# Altium schematic symbol library jlcpcb_2025_04_capacitors_extended_1206.schlib: 2503 symbols (part 12 of 14) (continued)
## NL1206B684K500CEDN
designator C?  Capacitance: 680nF  (hidden comment: *)
Capacitor, Ceramic (MLCC), 680nF, ±10%, 50V, ±10%, SMD 1206; Manufacturer: HUI JU; Manufacturer Part Number: NL1206B684K500CEDN; Package Size: 1206; JLCPCB Basic Part: No; JLCPCB Part Number: C2835168; Supplier 1: LCSC; Category: Capacitors - MLCC; Supplier Part Number 1: C2835168; Tolerance: ±10%; Voltage Rating: 50V; RoHS: Yes; ComponentLink1Description: Datasheet; ComponentLink1URL: https://wmsc.lcsc.com/wmsc/upload/file/pdf/v2/lcsc/2304140030_HUI-JU-NL1206B684K500CEDN_C2835168.pdf; ComponentLink2Description: JLCPCB Part URL; ComponentLink2URL: https://jlcpcb.com/partdetail/C2835168; ComponentLink3Description: LCSC Part URL; ComponentLink3URL: https://lcsc.com/product-detail/Multilayer-Ceramic-Capacitors-MLCC---SMD-SMT_HUI-JU-HUI-JU-NL1206B684K500CEDN_C2835168.html
footprint CAP-1206 (1206 (3216M) Capacitor)
pins: 1, 2

## NL1206B822K500CPBN
designator C?  Capacitance: 8.2nF  (hidden comment: *)
Capacitor, Ceramic (MLCC), 8.2nF, 50V, X7R, SMD 1206; Manufacturer: HUI JU; Manufacturer Part Number: NL1206B822K500CPBN; Package Size: 1206; JLCPCB Basic Part: No; JLCPCB Part Number: C2961030; Supplier 1: LCSC; Category: Capacitors - MLCC; Supplier Part Number 1: C2961030; Voltage Rating: 50V; Temperature Coefficient: X7R; RoHS: Yes; ComponentLink1Description: Datasheet; ComponentLink1URL: https://wmsc.lcsc.com/wmsc/upload/file/pdf/v2/lcsc/2201141700_HUI-JU-NL1206B822K500CPBN_C2961030.pdf; ComponentLink2Description: JLCPCB Part URL; ComponentLink2URL: https://jlcpcb.com/partdetail/C2961030; ComponentLink3Description: LCSC Part URL; ComponentLink3URL: https://lcsc.com/product-detail/Multilayer-Ceramic-Capacitors-MLCC---SMD-SMT_HUI-JU-HUI-JU-NL1206B822K500CPBN_C2961030.html
footprint CAP-1206 (1206 (3216M) Capacitor)
pins: 1, 2

## NL1206B823K500CPBN
designator C?  Capacitance: 82nF  (hidden comment: *)
Capacitor, Ceramic (MLCC), 82nF, ±10%, 50V, ±10%, SMD 1206; Manufacturer: HUI JU; Manufacturer Part Number: NL1206B823K500CPBN; Package Size: 1206; JLCPCB Basic Part: No; JLCPCB Part Number: C976248; Supplier 1: LCSC; Category: Capacitors - MLCC; Supplier Part Number 1: C976248; Tolerance: ±10%; Voltage Rating: 50V; RoHS: Yes; ComponentLink1Description: Datasheet; ComponentLink1URL: https://wmsc.lcsc.com/wmsc/upload/file/pdf/v2/lcsc/2304140030_HUI-JU-NL1206B823K500CPBN_C976248.pdf; ComponentLink2Description: JLCPCB Part URL; ComponentLink2URL: https://jlcpcb.com/partdetail/C976248; ComponentLink3Description: LCSC Part URL; ComponentLink3URL: https://lcsc.com/product-detail/Multilayer-Ceramic-Capacitors-MLCC---SMD-SMT_HUI-JU-HUI-JU-NL1206B823K500CPBN_C976248.html
footprint CAP-1206 (1206 (3216M) Capacitor)
pins: 1, 2

## NM1206B102M501CPBN
designator C?  Capacitance: 1nF  (hidden comment: *)
Capacitor, Ceramic (MLCC), 1nF, 500V, X7R, SMD 1206; Manufacturer: HUI JU; Manufacturer Part Number: NM1206B102M501CPBN; Package Size: 1206; JLCPCB Basic Part: No; JLCPCB Part Number: C2958820; Supplier 1: LCSC; Category: Capacitors - MLCC; Supplier Part Number 1: C2958820; Voltage Rating: 500V; Temperature Coefficient: X7R; RoHS: Yes; ComponentLink1Description: Datasheet; ComponentLink1URL: https://wmsc.lcsc.com/wmsc/upload/file/pdf/v2/lcsc/2201201730_HUI-JU-NM1206B102M501CPBN_C2958820.pdf; ComponentLink2Description: JLCPCB Part URL; ComponentLink2URL: https://jlcpcb.com/partdetail/C2958820; ComponentLink3Description: LCSC Part URL; ComponentLink3URL: https://lcsc.com/product-detail/Multilayer-Ceramic-Capacitors-MLCC---SMD-SMT_HUI-JU-HUI-JU-NM1206B102M501CPBN_C2958820.html
footprint CAP-1206 (1206 (3216M) Capacitor)
pins: 1, 2

## NM1206B103K251CPBN
designator C?  Capacitance: 10nF  (hidden comment: *)
Capacitor, Ceramic (MLCC), 10nF, 250V, SMD 1206; Manufacturer: HUI JU; Manufacturer Part Number: NM1206B103K251CPBN; Package Size: 1206; JLCPCB Basic Part: No; JLCPCB Part Number: C2760335; Supplier 1: LCSC; Category: Capacitors - MLCC; Supplier Part Number 1: C2760335; Voltage Rating: 250V; RoHS: Yes; ComponentLink1Description: Datasheet; ComponentLink1URL: https://wmsc.lcsc.com/wmsc/upload/file/pdf/v2/lcsc/2304140030_HUI-JU-NM1206B103K251CPBN_C2760335.pdf; ComponentLink2Description: JLCPCB Part URL; ComponentLink2URL: https://jlcpcb.com/partdetail/C2760335; ComponentLink3Description: LCSC Part URL; ComponentLink3URL: https://lcsc.com/product-detail/Multilayer-Ceramic-Capacitors-MLCC---SMD-SMT_HUI-JU-HUI-JU-NM1206B103K251CPBN_C2760335.html
footprint CAP-1206 (1206 (3216M) Capacitor)
pins: 1, 2

## NM1206B104K101CEDN
designator C?  Capacitance: 100nF  (hidden comment: *)
Capacitor, Ceramic (MLCC), 100nF, ±10%, 100V, X7R, ±10%, SMD 1206; Manufacturer: HUI JU; Manufacturer Part Number: NM1206B104K101CEDN; Package Size: 1206; JLCPCB Basic Part: No; JLCPCB Part Number: C710465; Supplier 1: LCSC; Category: Capacitors - MLCC; Supplier Part Number 1: C710465; Tolerance: ±10%; Voltage Rating: 100V; Temperature Coefficient: X7R; RoHS: Yes; ComponentLink1Description: Datasheet; ComponentLink1URL: https://wmsc.lcsc.com/wmsc/upload/file/pdf/v2/lcsc/2304140030_HUI-JU-NM1206B104K101CEDN_C710465.pdf; ComponentLink2Description: JLCPCB Part URL; ComponentLink2URL: https://jlcpcb.com/partdetail/C710465; ComponentLink3Description: LCSC Part URL; ComponentLink3URL: https://lcsc.com/product-detail/Multilayer-Ceramic-Capacitors-MLCC---SMD-SMT_HUI-JU-HUI-JU-NM1206B104K101CEDN_C710465.html
footprint CAP-1206 (1206 (3216M) Capacitor)
pins: 1, 2

## NM1206B104K101CPBN
designator C?  Capacitance: 100nF  (hidden comment: *)
Capacitor, Ceramic (MLCC), 100nF, ±10%, 100V, ±10%, SMD 1206; Manufacturer: HUI JU; Manufacturer Part Number: NM1206B104K101CPBN; Package Size: 1206; JLCPCB Basic Part: No; JLCPCB Part Number: C969992; Supplier 1: LCSC; Category: Capacitors - MLCC; Supplier Part Number 1: C969992; Tolerance: ±10%; Voltage Rating: 100V; RoHS: Yes; ComponentLink1Description: Datasheet; ComponentLink1URL: https://wmsc.lcsc.com/wmsc/upload/file/pdf/v2/lcsc/2304140030_HUI-JU-NM1206B104K101CPBN_C969992.pdf; ComponentLink2Description: JLCPCB Part URL; ComponentLink2URL: https://jlcpcb.com/partdetail/C969992; ComponentLink3Description: LCSC Part URL; ComponentLink3URL: https://lcsc.com/product-detail/Multilayer-Ceramic-Capacitors-MLCC---SMD-SMT_HUI-JU-HUI-JU-NM1206B104K101CPBN_C969992.html
footprint CAP-1206 (1206 (3216M) Capacitor)
pins: 1, 2

## NM1206B104K251CEDN
designator C?  Capacitance: 100nF  (hidden comment: *)
Capacitor, Ceramic (MLCC), 100nF, ±10%, 250V, X7R, ±10%, SMD 1206; Manufacturer: HUI JU; Manufacturer Part Number: NM1206B104K251CEDN; Package Size: 1206; JLCPCB Basic Part: No; JLCPCB Part Number: C710466; Supplier 1: LCSC; Category: Capacitors - MLCC; Supplier Part Number 1: C710466; Tolerance: ±10%; Voltage Rating: 250V; Temperature Coefficient: X7R; RoHS: Yes; ComponentLink1Description: Datasheet; ComponentLink1URL: https://wmsc.lcsc.com/wmsc/upload/file/pdf/v2/lcsc/2304140030_HUI-JU-NM1206B104K251CEDN_C710466.pdf; ComponentLink2Description: JLCPCB Part URL; ComponentLink2URL: https://jlcpcb.com/partdetail/C710466; ComponentLink3Description: LCSC Part URL; ComponentLink3URL: https://lcsc.com/product-detail/Multilayer-Ceramic-Capacitors-MLCC---SMD-SMT_HUI-JU-HUI-JU-NM1206B104K251CEDN_C710466.html
footprint CAP-1206 (1206 (3216M) Capacitor)
pins: 1, 2

## NM1206B104K251CEGN
designator C?  Capacitance: 100nF  (hidden comment: *)
Capacitor, Ceramic (MLCC), 100nF, ±10%, 250V, X7R, ±10%, SMD 1206; Manufacturer: HUI JU; Manufacturer Part Number: NM1206B104K251CEGN; Package Size: 1206; JLCPCB Basic Part: No; JLCPCB Part Number: C710467; Supplier 1: LCSC; Category: Capacitors - MLCC; Supplier Part Number 1: C710467; Tolerance: ±10%; Voltage Rating: 250V; Temperature Coefficient: X7R; RoHS: Yes; ComponentLink1Description: Datasheet; ComponentLink1URL: https://wmsc.lcsc.com/wmsc/upload/file/pdf/v2/lcsc/2304140030_HUI-JU-NM1206B104K251CEGN_C710467.pdf; ComponentLink2Description: JLCPCB Part URL; ComponentLink2URL: https://jlcpcb.com/partdetail/C710467; ComponentLink3Description: LCSC Part URL; ComponentLink3URL: https://lcsc.com/product-detail/Multilayer-Ceramic-Capacitors-MLCC---SMD-SMT_HUI-JU-HUI-JU-NM1206B104K251CEGN_C710467.html
footprint CAP-1206 (1206 (3216M) Capacitor)
pins: 1, 2

## NM1206B104K451CEDN
designator C?  Capacitance: 100nF  (hidden comment: *)
Capacitor, Ceramic (MLCC), 100nF, ±10%, 450V, ±10%, SMD 1206; Manufacturer: HUI JU; Manufacturer Part Number: NM1206B104K451CEDN; Package Size: 1206; JLCPCB Basic Part: No; JLCPCB Part Number: C780701; Supplier 1: LCSC; Category: Capacitors - MLCC; Supplier Part Number 1: C780701; Tolerance: ±10%; Voltage Rating: 450V; RoHS: Yes; ComponentLink1Description: Datasheet; ComponentLink1URL: https://wmsc.lcsc.com/wmsc/upload/file/pdf/v2/lcsc/2304140030_HUI-JU-NM1206B104K451CEDN_C780701.pdf; ComponentLink2Description: JLCPCB Part URL; ComponentLink2URL: https://jlcpcb.com/partdetail/C780701; ComponentLink3Description: LCSC Part URL; ComponentLink3URL: https://lcsc.com/product-detail/Multilayer-Ceramic-Capacitors-MLCC---SMD-SMT_HUI-JU-HUI-JU-NM1206B104K451CEDN_C780701.html
footprint CAP-1206 (1206 (3216M) Capacitor)
pins: 1, 2

## NM1206B104K451CEGN
designator C?  Capacitance: 100nF  (hidden comment: *)
Capacitor, Ceramic (MLCC), 100nF, ±10%, 450V, X7R, ±10%, SMD 1206; Manufacturer: HUI JU; Manufacturer Part Number: NM1206B104K451CEGN; Package Size: 1206; JLCPCB Basic Part: No; JLCPCB Part Number: C710468; Supplier 1: LCSC; Category: Capacitors - MLCC; Supplier Part Number 1: C710468; Tolerance: ±10%; Voltage Rating: 450V; Temperature Coefficient: X7R; RoHS: Yes; ComponentLink1Description: Datasheet; ComponentLink1URL: https://wmsc.lcsc.com/wmsc/upload/file/pdf/v2/lcsc/2304140030_HUI-JU-NM1206B104K451CEGN_C710468.pdf; ComponentLink2Description: JLCPCB Part URL; ComponentLink2URL: https://jlcpcb.com/partdetail/C710468; ComponentLink3Description: LCSC Part URL; ComponentLink3URL: https://lcsc.com/product-detail/Multilayer-Ceramic-Capacitors-MLCC---SMD-SMT_HUI-JU-HUI-JU-NM1206B104K451CEGN_C710468.html
footprint CAP-1206 (1206 (3216M) Capacitor)
pins: 1, 2

## NM1206B104K501CEGN
designator C?  Capacitance: 100nF  (hidden comment: *)
Capacitor, Ceramic (MLCC), 100nF, ±10%, 500V, X7R, ±10%, SMD 1206; Manufacturer: HUI JU; Manufacturer Part Number: NM1206B104K501CEGN; Package Size: 1206; JLCPCB Basic Part: No; JLCPCB Part Number: C2843479; Supplier 1: LCSC; Category: Capacitors - MLCC; Supplier Part Number 1: C2843479; Tolerance: ±10%; Voltage Rating: 500V; Temperature Coefficient: X7R; RoHS: Yes; ComponentLink1Description: Datasheet; ComponentLink1URL: https://wmsc.lcsc.com/wmsc/upload/file/pdf/v2/lcsc/2201201730_HUI-JU-NM1206B104K501CEGN_C2843479.pdf; ComponentLink2Description: JLCPCB Part URL; ComponentLink2URL: https://jlcpcb.com/partdetail/C2843479; ComponentLink3Description: LCSC Part URL; ComponentLink3URL: https://lcsc.com/product-detail/Multilayer-Ceramic-Capacitors-MLCC---SMD-SMT_HUI-JU-HUI-JU-NM1206B104K501CEGN_C2843479.html
footprint CAP-1206 (1206 (3216M) Capacitor)
pins: 1, 2

## NM1206B104M101CEDN
designator C?  Capacitance: 100nF  (hidden comment: *)
Capacitor, Ceramic (MLCC), 100nF, ±20%, 100V, X7R, ±20%, SMD 1206; Manufacturer: HUI JU; Manufacturer Part Number: NM1206B104M101CEDN; Package Size: 1206; JLCPCB Basic Part: No; JLCPCB Part Number: C840121; Supplier 1: LCSC; Category: Capacitors - MLCC; Supplier Part Number 1: C840121; Tolerance: ±20%; Voltage Rating: 100V; Temperature Coefficient: X7R; RoHS: Yes; ComponentLink1Description: Datasheet; ComponentLink1URL: https://wmsc.lcsc.com/wmsc/upload/file/pdf/v2/lcsc/2304140030_HUI-JU-NM1206B104M101CEDN_C840121.pdf; ComponentLink2Description: JLCPCB Part URL; ComponentLink2URL: https://jlcpcb.com/partdetail/C840121; ComponentLink3Description: LCSC Part URL; ComponentLink3URL: https://lcsc.com/product-detail/Multilayer-Ceramic-Capacitors-MLCC---SMD-SMT_HUI-JU-HUI-JU-NM1206B104M101CEDN_C840121.html
footprint CAP-1206 (1206 (3216M) Capacitor)
pins: 1, 2

## NM1206B104M251CEDN
designator C?  Capacitance: 100nF  (hidden comment: *)
Capacitor, Ceramic (MLCC), 100nF, 250V, X7R, SMD 1206; Manufacturer: HUI JU; Manufacturer Part Number: NM1206B104M251CEDN; Package Size: 1206; JLCPCB Basic Part: No; JLCPCB Part Number: C2958822; Supplier 1: LCSC; Category: Capacitors - MLCC; Supplier Part Number 1: C2958822; Voltage Rating: 250V; Temperature Coefficient: X7R; RoHS: Yes; ComponentLink1Description: Datasheet; ComponentLink1URL: https://wmsc.lcsc.com/wmsc/upload/file/pdf/v2/lcsc/2201201730_HUI-JU-NM1206B104M251CEDN_C2958822.pdf; ComponentLink2Description: JLCPCB Part URL; ComponentLink2URL: https://jlcpcb.com/partdetail/C2958822; ComponentLink3Description: LCSC Part URL; ComponentLink3URL: https://lcsc.com/product-detail/Multilayer-Ceramic-Capacitors-MLCC---SMD-SMT_HUI-JU-HUI-JU-NM1206B104M251CEDN_C2958822.html
footprint CAP-1206 (1206 (3216M) Capacitor)
pins: 1, 2

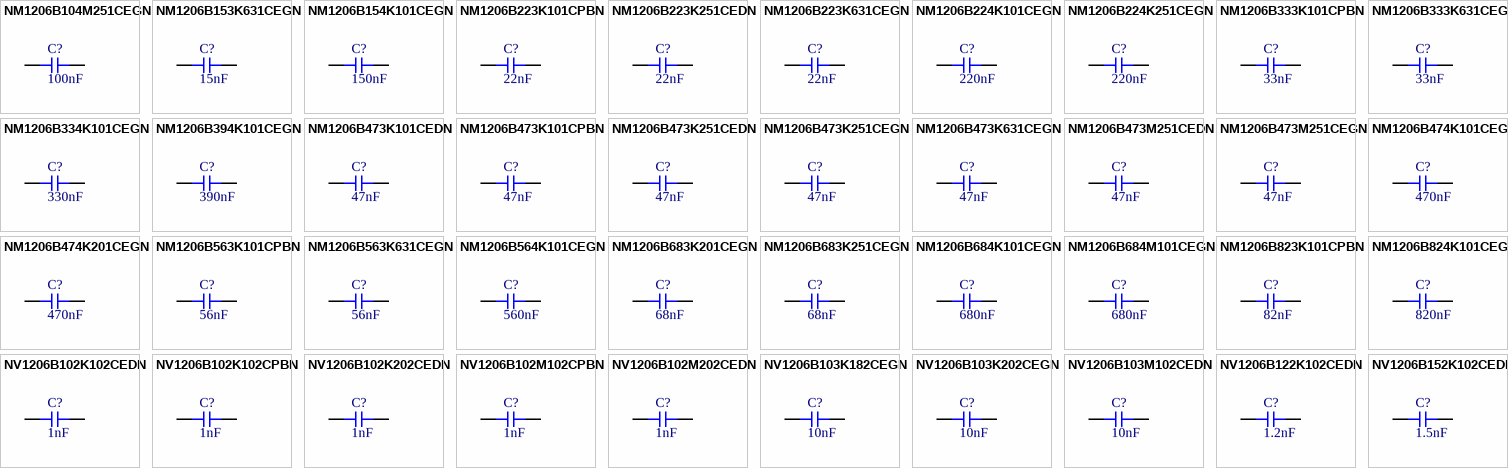
[diagram p54: symbols NM1206B104M251CEGN to NV1206B152K102CEDN]

## NM1206B104M251CEGN
designator C?  Capacitance: 100nF  (hidden comment: *)
Capacitor, Ceramic (MLCC), 100nF, ±20%, 250V, X7R, ±20%, SMD 1206; Manufacturer: HUI JU; Manufacturer Part Number: NM1206B104M251CEGN; Package Size: 1206; JLCPCB Basic Part: No; JLCPCB Part Number: C717017; Supplier 1: LCSC; Category: Capacitors - MLCC; Supplier Part Number 1: C717017; Tolerance: ±20%; Voltage Rating: 250V; Temperature Coefficient: X7R; RoHS: Yes; ComponentLink1Description: Datasheet; ComponentLink1URL: https://wmsc.lcsc.com/wmsc/upload/file/pdf/v2/lcsc/2304140030_HUI-JU-NM1206B104M251CEGN_C717017.pdf; ComponentLink2Description: JLCPCB Part URL; ComponentLink2URL: https://jlcpcb.com/partdetail/C717017; ComponentLink3Description: LCSC Part URL; ComponentLink3URL: https://lcsc.com/product-detail/Multilayer-Ceramic-Capacitors-MLCC---SMD-SMT_HUI-JU-HUI-JU-NM1206B104M251CEGN_C717017.html
footprint CAP-1206 (1206 (3216M) Capacitor)
pins: 1, 2

## NM1206B153K631CEGN
designator C?  Capacitance: 15nF  (hidden comment: *)
Capacitor, Ceramic (MLCC), 15nF, ±10%, 630V, X7R, ±10%, SMD 1206; Manufacturer: HUI JU; Manufacturer Part Number: NM1206B153K631CEGN; Package Size: 1206; JLCPCB Basic Part: No; JLCPCB Part Number: C840123; Supplier 1: LCSC; Category: Capacitors - MLCC; Supplier Part Number 1: C840123; Tolerance: ±10%; Voltage Rating: 630V; Temperature Coefficient: X7R; RoHS: Yes; ComponentLink1Description: Datasheet; ComponentLink1URL: https://wmsc.lcsc.com/wmsc/upload/file/pdf/v2/lcsc/2304140030_HUI-JU-NM1206B153K631CEGN_C840123.pdf; ComponentLink2Description: JLCPCB Part URL; ComponentLink2URL: https://jlcpcb.com/partdetail/C840123; ComponentLink3Description: LCSC Part URL; ComponentLink3URL: https://lcsc.com/product-detail/Multilayer-Ceramic-Capacitors-MLCC---SMD-SMT_HUI-JU-HUI-JU-NM1206B153K631CEGN_C840123.html
footprint CAP-1206 (1206 (3216M) Capacitor)
pins: 1, 2

## NM1206B154K101CEGN
designator C?  Capacitance: 150nF  (hidden comment: *)
Capacitor, Ceramic (MLCC), 150nF, ±10%, 100V, X7R, ±10%, SMD 1206; Manufacturer: HUI JU; Manufacturer Part Number: NM1206B154K101CEGN; Package Size: 1206; JLCPCB Basic Part: No; JLCPCB Part Number: C2843482; Supplier 1: LCSC; Category: Capacitors - MLCC; Supplier Part Number 1: C2843482; Tolerance: ±10%; Voltage Rating: 100V; Temperature Coefficient: X7R; RoHS: Yes; ComponentLink1Description: Datasheet; ComponentLink1URL: https://wmsc.lcsc.com/wmsc/upload/file/pdf/v2/lcsc/2201201730_HUI-JU-NM1206B154K101CEGN_C2843482.pdf; ComponentLink2Description: JLCPCB Part URL; ComponentLink2URL: https://jlcpcb.com/partdetail/C2843482; ComponentLink3Description: LCSC Part URL; ComponentLink3URL: https://lcsc.com/product-detail/Multilayer-Ceramic-Capacitors-MLCC---SMD-SMT_HUI-JU-HUI-JU-NM1206B154K101CEGN_C2843482.html
footprint CAP-1206 (1206 (3216M) Capacitor)
pins: 1, 2

## NM1206B223K101CPBN
designator C?  Capacitance: 22nF  (hidden comment: *)
Capacitor, Ceramic (MLCC), 22nF, ±10%, 100V, ±10%, SMD 1206; Manufacturer: HUI JU; Manufacturer Part Number: NM1206B223K101CPBN; Package Size: 1206; JLCPCB Basic Part: No; JLCPCB Part Number: C2760333; Supplier 1: LCSC; Category: Capacitors - MLCC; Supplier Part Number 1: C2760333; Tolerance: ±10%; Voltage Rating: 100V; RoHS: Yes; ComponentLink1Description: Datasheet; ComponentLink1URL: https://wmsc.lcsc.com/wmsc/upload/file/pdf/v2/lcsc/2304140030_HUI-JU-NM1206B223K101CPBN_C2760333.pdf; ComponentLink2Description: JLCPCB Part URL; ComponentLink2URL: https://jlcpcb.com/partdetail/C2760333; ComponentLink3Description: LCSC Part URL; ComponentLink3URL: https://lcsc.com/product-detail/Multilayer-Ceramic-Capacitors-MLCC---SMD-SMT_HUI-JU-HUI-JU-NM1206B223K101CPBN_C2760333.html
footprint CAP-1206 (1206 (3216M) Capacitor)
pins: 1, 2

## NM1206B223K251CEDN
designator C?  Capacitance: 22nF  (hidden comment: *)
Capacitor, Ceramic (MLCC), 22nF, ±10%, 250V, ±10%, SMD 1206; Manufacturer: HUI JU; Manufacturer Part Number: NM1206B223K251CEDN; Package Size: 1206; JLCPCB Basic Part: No; JLCPCB Part Number: C2760342; Supplier 1: LCSC; Category: Capacitors - MLCC; Supplier Part Number 1: C2760342; Tolerance: ±10%; Voltage Rating: 250V; RoHS: Yes; ComponentLink1Description: Datasheet; ComponentLink1URL: https://wmsc.lcsc.com/wmsc/upload/file/pdf/v2/lcsc/2304140030_HUI-JU-NM1206B223K251CEDN_C2760342.pdf; ComponentLink2Description: JLCPCB Part URL; ComponentLink2URL: https://jlcpcb.com/partdetail/C2760342; ComponentLink3Description: LCSC Part URL; ComponentLink3URL: https://lcsc.com/product-detail/Multilayer-Ceramic-Capacitors-MLCC---SMD-SMT_HUI-JU-HUI-JU-NM1206B223K251CEDN_C2760342.html
footprint CAP-1206 (1206 (3216M) Capacitor)
pins: 1, 2

## NM1206B223K631CEGN
designator C?  Capacitance: 22nF  (hidden comment: *)
Capacitor, Ceramic (MLCC), 22nF, ±10%, 630V, X7R, ±10%, SMD 1206; Manufacturer: HUI JU; Manufacturer Part Number: NM1206B223K631CEGN; Package Size: 1206; JLCPCB Basic Part: No; JLCPCB Part Number: C710474; Supplier 1: LCSC; Category: Capacitors - MLCC; Supplier Part Number 1: C710474; Tolerance: ±10%; Voltage Rating: 630V; Temperature Coefficient: X7R; RoHS: Yes; ComponentLink1Description: Datasheet; ComponentLink1URL: https://wmsc.lcsc.com/wmsc/upload/file/pdf/v2/lcsc/2304140030_HUI-JU-NM1206B223K631CEGN_C710474.pdf; ComponentLink2Description: JLCPCB Part URL; ComponentLink2URL: https://jlcpcb.com/partdetail/C710474; ComponentLink3Description: LCSC Part URL; ComponentLink3URL: https://lcsc.com/product-detail/Multilayer-Ceramic-Capacitors-MLCC---SMD-SMT_HUI-JU-HUI-JU-NM1206B223K631CEGN_C710474.html
footprint CAP-1206 (1206 (3216M) Capacitor)
pins: 1, 2

## NM1206B224K101CEGN
designator C?  Capacitance: 220nF  (hidden comment: *)
Capacitor, Ceramic (MLCC), 220nF, ±10%, 100V, X7R, ±10%, SMD 1206; Manufacturer: HUI JU; Manufacturer Part Number: NM1206B224K101CEGN; Package Size: 1206; JLCPCB Basic Part: No; JLCPCB Part Number: C710475; Supplier 1: LCSC; Category: Capacitors - MLCC; Supplier Part Number 1: C710475; Tolerance: ±10%; Voltage Rating: 100V; Temperature Coefficient: X7R; RoHS: Yes; ComponentLink1Description: Datasheet; ComponentLink1URL: https://wmsc.lcsc.com/wmsc/upload/file/pdf/v2/lcsc/2304140030_HUI-JU-NM1206B224K101CEGN_C710475.pdf; ComponentLink2Description: JLCPCB Part URL; ComponentLink2URL: https://jlcpcb.com/partdetail/C710475; ComponentLink3Description: LCSC Part URL; ComponentLink3URL: https://lcsc.com/product-detail/Multilayer-Ceramic-Capacitors-MLCC---SMD-SMT_HUI-JU-HUI-JU-NM1206B224K101CEGN_C710475.html
footprint CAP-1206 (1206 (3216M) Capacitor)
pins: 1, 2

## NM1206B224K251CEGN
designator C?  Capacitance: 220nF  (hidden comment: *)
Capacitor, Ceramic (MLCC), 220nF, ±10%, 250V, X7R, ±10%, SMD 1206; Manufacturer: HUI JU; Manufacturer Part Number: NM1206B224K251CEGN; Package Size: 1206; JLCPCB Basic Part: No; JLCPCB Part Number: C780706; Supplier 1: LCSC; Category: Capacitors - MLCC; Supplier Part Number 1: C780706; Tolerance: ±10%; Voltage Rating: 250V; Temperature Coefficient: X7R; RoHS: Yes; ComponentLink1Description: Datasheet; ComponentLink1URL: https://wmsc.lcsc.com/wmsc/upload/file/pdf/v2/lcsc/2304140030_HUI-JU-NM1206B224K251CEGN_C780706.pdf; ComponentLink2Description: JLCPCB Part URL; ComponentLink2URL: https://jlcpcb.com/partdetail/C780706; ComponentLink3Description: LCSC Part URL; ComponentLink3URL: https://lcsc.com/product-detail/Multilayer-Ceramic-Capacitors-MLCC---SMD-SMT_HUI-JU-HUI-JU-NM1206B224K251CEGN_C780706.html
footprint CAP-1206 (1206 (3216M) Capacitor)
pins: 1, 2

## NM1206B333K101CPBN
designator C?  Capacitance: 33nF  (hidden comment: *)
Capacitor, Ceramic (MLCC), 33nF, ±10%, 100V, ±10%, SMD 1206; Manufacturer: HUI JU; Manufacturer Part Number: NM1206B333K101CPBN; Package Size: 1206; JLCPCB Basic Part: No; JLCPCB Part Number: C841560; Supplier 1: LCSC; Category: Capacitors - MLCC; Supplier Part Number 1: C841560; Tolerance: ±10%; Voltage Rating: 100V; RoHS: Yes; ComponentLink1Description: Datasheet; ComponentLink1URL: https://wmsc.lcsc.com/wmsc/upload/file/pdf/v2/lcsc/2304140030_HUI-JU-NM1206B333K101CPBN_C841560.pdf; ComponentLink2Description: JLCPCB Part URL; ComponentLink2URL: https://jlcpcb.com/partdetail/C841560; ComponentLink3Description: LCSC Part URL; ComponentLink3URL: https://lcsc.com/product-detail/Multilayer-Ceramic-Capacitors-MLCC---SMD-SMT_HUI-JU-HUI-JU-NM1206B333K101CPBN_C841560.html
footprint CAP-1206 (1206 (3216M) Capacitor)
pins: 1, 2

## NM1206B333K631CEGN
designator C?  Capacitance: 33nF  (hidden comment: *)
Capacitor, Ceramic (MLCC), 33nF, ±10%, 630V, X7R, ±10%, SMD 1206; Manufacturer: HUI JU; Manufacturer Part Number: NM1206B333K631CEGN; Package Size: 1206; JLCPCB Basic Part: No; JLCPCB Part Number: C710477; Supplier 1: LCSC; Category: Capacitors - MLCC; Supplier Part Number 1: C710477; Tolerance: ±10%; Voltage Rating: 630V; Temperature Coefficient: X7R; RoHS: Yes; ComponentLink1Description: Datasheet; ComponentLink1URL: https://wmsc.lcsc.com/wmsc/upload/file/pdf/v2/lcsc/2304140030_HUI-JU-NM1206B333K631CEGN_C710477.pdf; ComponentLink2Description: JLCPCB Part URL; ComponentLink2URL: https://jlcpcb.com/partdetail/C710477; ComponentLink3Description: LCSC Part URL; ComponentLink3URL: https://lcsc.com/product-detail/Multilayer-Ceramic-Capacitors-MLCC---SMD-SMT_HUI-JU-HUI-JU-NM1206B333K631CEGN_C710477.html
footprint CAP-1206 (1206 (3216M) Capacitor)
pins: 1, 2

## NM1206B334K101CEGN
designator C?  Capacitance: 330nF  (hidden comment: *)
Capacitor, Ceramic (MLCC), 330nF, ±10%, 100V, X7R, ±10%, SMD 1206; Manufacturer: HUI JU; Manufacturer Part Number: NM1206B334K101CEGN; Package Size: 1206; JLCPCB Basic Part: No; JLCPCB Part Number: C710478; Supplier 1: LCSC; Category: Capacitors - MLCC; Supplier Part Number 1: C710478; Tolerance: ±10%; Voltage Rating: 100V; Temperature Coefficient: X7R; RoHS: Yes; ComponentLink1Description: Datasheet; ComponentLink1URL: https://wmsc.lcsc.com/wmsc/upload/file/pdf/v2/lcsc/2304140030_HUI-JU-NM1206B334K101CEGN_C710478.pdf; ComponentLink2Description: JLCPCB Part URL; ComponentLink2URL: https://jlcpcb.com/partdetail/C710478; ComponentLink3Description: LCSC Part URL; ComponentLink3URL: https://lcsc.com/product-detail/Multilayer-Ceramic-Capacitors-MLCC---SMD-SMT_HUI-JU-HUI-JU-NM1206B334K101CEGN_C710478.html
footprint CAP-1206 (1206 (3216M) Capacitor)
pins: 1, 2

## NM1206B394K101CEGN
designator C?  Capacitance: 390nF  (hidden comment: *)
Capacitor, Ceramic (MLCC), 390nF, ±10%, 100V, X7R, ±10%, SMD 1206; Manufacturer: HUI JU; Manufacturer Part Number: NM1206B394K101CEGN; Package Size: 1206; JLCPCB Basic Part: No; JLCPCB Part Number: C840125; Supplier 1: LCSC; Category: Capacitors - MLCC; Supplier Part Number 1: C840125; Tolerance: ±10%; Voltage Rating: 100V; Temperature Coefficient: X7R; RoHS: Yes; ComponentLink1Description: Datasheet; ComponentLink1URL: https://wmsc.lcsc.com/wmsc/upload/file/pdf/v2/lcsc/2304140030_HUI-JU-NM1206B394K101CEGN_C840125.pdf; ComponentLink2Description: JLCPCB Part URL; ComponentLink2URL: https://jlcpcb.com/partdetail/C840125; ComponentLink3Description: LCSC Part URL; ComponentLink3URL: https://lcsc.com/product-detail/Multilayer-Ceramic-Capacitors-MLCC---SMD-SMT_HUI-JU-HUI-JU-NM1206B394K101CEGN_C840125.html
footprint CAP-1206 (1206 (3216M) Capacitor)
pins: 1, 2

## NM1206B473K101CEDN
designator C?  Capacitance: 47nF  (hidden comment: *)
Capacitor, Ceramic (MLCC), 47nF, 100V, SMD 1206; Manufacturer: HUI JU; Manufacturer Part Number: NM1206B473K101CEDN; Package Size: 1206; JLCPCB Basic Part: No; JLCPCB Part Number: C2760345; Supplier 1: LCSC; Category: Capacitors - MLCC; Supplier Part Number 1: C2760345; Voltage Rating: 100V; RoHS: Yes; ComponentLink1Description: Datasheet; ComponentLink1URL: https://wmsc.lcsc.com/wmsc/upload/file/pdf/v2/lcsc/2304140030_HUI-JU-NM1206B473K101CEDN_C2760345.pdf; ComponentLink2Description: JLCPCB Part URL; ComponentLink2URL: https://jlcpcb.com/partdetail/C2760345; ComponentLink3Description: LCSC Part URL; ComponentLink3URL: https://lcsc.com/product-detail/Multilayer-Ceramic-Capacitors-MLCC---SMD-SMT_HUI-JU-HUI-JU-NM1206B473K101CEDN_C2760345.html
footprint CAP-1206 (1206 (3216M) Capacitor)
pins: 1, 2

## NM1206B473K101CPBN
designator C?  Capacitance: 47nF  (hidden comment: *)
Capacitor, Ceramic (MLCC), 47nF, 100V, SMD 1206; Manufacturer: HUI JU; Manufacturer Part Number: NM1206B473K101CPBN; Package Size: 1206; JLCPCB Basic Part: No; JLCPCB Part Number: C2835164; Supplier 1: LCSC; Category: Capacitors - MLCC; Supplier Part Number 1: C2835164; Voltage Rating: 100V; RoHS: Yes; ComponentLink1Description: Datasheet; ComponentLink1URL: https://wmsc.lcsc.com/wmsc/upload/file/pdf/v2/lcsc/2304140030_HUI-JU-NM1206B473K101CPBN_C2835164.pdf; ComponentLink2Description: JLCPCB Part URL; ComponentLink2URL: https://jlcpcb.com/partdetail/C2835164; ComponentLink3Description: LCSC Part URL; ComponentLink3URL: https://lcsc.com/product-detail/Multilayer-Ceramic-Capacitors-MLCC---SMD-SMT_HUI-JU-HUI-JU-NM1206B473K101CPBN_C2835164.html
footprint CAP-1206 (1206 (3216M) Capacitor)
pins: 1, 2

## NM1206B473K251CEDN
designator C?  Capacitance: 47nF  (hidden comment: *)
Capacitor, Ceramic (MLCC), 47nF, ±10%, 250V, ±10%, SMD 1206; Manufacturer: HUI JU; Manufacturer Part Number: NM1206B473K251CEDN; Package Size: 1206; JLCPCB Basic Part: No; JLCPCB Part Number: C780705; Supplier 1: LCSC; Category: Capacitors - MLCC; Supplier Part Number 1: C780705; Tolerance: ±10%; Voltage Rating: 250V; RoHS: Yes; ComponentLink1Description: Datasheet; ComponentLink1URL: https://wmsc.lcsc.com/wmsc/upload/file/pdf/v2/lcsc/2304140030_HUI-JU-NM1206B473K251CEDN_C780705.pdf; ComponentLink2Description: JLCPCB Part URL; ComponentLink2URL: https://jlcpcb.com/partdetail/C780705; ComponentLink3Description: LCSC Part URL; ComponentLink3URL: https://lcsc.com/product-detail/Multilayer-Ceramic-Capacitors-MLCC---SMD-SMT_HUI-JU-HUI-JU-NM1206B473K251CEDN_C780705.html
footprint CAP-1206 (1206 (3216M) Capacitor)
pins: 1, 2

## NM1206B473K251CEGN
designator C?  Capacitance: 47nF  (hidden comment: *)
Capacitor, Ceramic (MLCC), 47nF, ±10%, 250V, X7R, ±10%, SMD 1206; Manufacturer: HUI JU; Manufacturer Part Number: NM1206B473K251CEGN; Package Size: 1206; JLCPCB Basic Part: No; JLCPCB Part Number: C840128; Supplier 1: LCSC; Category: Capacitors - MLCC; Supplier Part Number 1: C840128; Tolerance: ±10%; Voltage Rating: 250V; Temperature Coefficient: X7R; RoHS: Yes; ComponentLink1Description: Datasheet; ComponentLink1URL: https://wmsc.lcsc.com/wmsc/upload/file/pdf/v2/lcsc/2304140030_HUI-JU-NM1206B473K251CEGN_C840128.pdf; ComponentLink2Description: JLCPCB Part URL; ComponentLink2URL: https://jlcpcb.com/partdetail/C840128; ComponentLink3Description: LCSC Part URL; ComponentLink3URL: https://lcsc.com/product-detail/Multilayer-Ceramic-Capacitors-MLCC---SMD-SMT_HUI-JU-HUI-JU-NM1206B473K251CEGN_C840128.html
footprint CAP-1206 (1206 (3216M) Capacitor)
pins: 1, 2

## NM1206B473K631CEGN
designator C?  Capacitance: 47nF  (hidden comment: *)
Capacitor, Ceramic (MLCC), 47nF, ±10%, 630V, X7R, ±10%, SMD 1206; Manufacturer: HUI JU; Manufacturer Part Number: NM1206B473K631CEGN; Package Size: 1206; JLCPCB Basic Part: No; JLCPCB Part Number: C717020; Supplier 1: LCSC; Category: Capacitors - MLCC; Supplier Part Number 1: C717020; Tolerance: ±10%; Voltage Rating: 630V; Temperature Coefficient: X7R; RoHS: Yes; ComponentLink1Description: Datasheet; ComponentLink1URL: https://wmsc.lcsc.com/wmsc/upload/file/pdf/v2/lcsc/2304140030_HUI-JU-NM1206B473K631CEGN_C717020.pdf; ComponentLink2Description: JLCPCB Part URL; ComponentLink2URL: https://jlcpcb.com/partdetail/C717020; ComponentLink3Description: LCSC Part URL; ComponentLink3URL: https://lcsc.com/product-detail/Multilayer-Ceramic-Capacitors-MLCC---SMD-SMT_HUI-JU-HUI-JU-NM1206B473K631CEGN_C717020.html
footprint CAP-1206 (1206 (3216M) Capacitor)
pins: 1, 2

## NM1206B473M251CEDN
designator C?  Capacitance: 47nF  (hidden comment: *)
Capacitor, Ceramic (MLCC), 47nF, ±20%, 250V, X7R, ±20%, SMD 1206; Manufacturer: HUI JU; Manufacturer Part Number: NM1206B473M251CEDN; Package Size: 1206; JLCPCB Basic Part: No; JLCPCB Part Number: C840129; Supplier 1: LCSC; Category: Capacitors - MLCC; Supplier Part Number 1: C840129; Tolerance: ±20%; Voltage Rating: 250V; Temperature Coefficient: X7R; RoHS: Yes; ComponentLink1Description: Datasheet; ComponentLink1URL: https://wmsc.lcsc.com/wmsc/upload/file/pdf/v2/lcsc/2304140030_HUI-JU-NM1206B473M251CEDN_C840129.pdf; ComponentLink2Description: JLCPCB Part URL; ComponentLink2URL: https://jlcpcb.com/partdetail/C840129; ComponentLink3Description: LCSC Part URL; ComponentLink3URL: https://lcsc.com/product-detail/Multilayer-Ceramic-Capacitors-MLCC---SMD-SMT_HUI-JU-HUI-JU-NM1206B473M251CEDN_C840129.html
footprint CAP-1206 (1206 (3216M) Capacitor)
pins: 1, 2

## NM1206B473M251CEGN
designator C?  Capacitance: 47nF  (hidden comment: *)
Capacitor, Ceramic (MLCC), 47nF, ±20%, 250V, ±20%, SMD 1206; Manufacturer: HUI JU; Manufacturer Part Number: NM1206B473M251CEGN; Package Size: 1206; JLCPCB Basic Part: No; JLCPCB Part Number: C2760348; Supplier 1: LCSC; Category: Capacitors - MLCC; Supplier Part Number 1: C2760348; Tolerance: ±20%; Voltage Rating: 250V; RoHS: Yes; ComponentLink1Description: Datasheet; ComponentLink1URL: https://wmsc.lcsc.com/wmsc/upload/file/pdf/v2/lcsc/2304140030_HUI-JU-NM1206B473M251CEGN_C2760348.pdf; ComponentLink2Description: JLCPCB Part URL; ComponentLink2URL: https://jlcpcb.com/partdetail/C2760348; ComponentLink3Description: LCSC Part URL; ComponentLink3URL: https://lcsc.com/product-detail/Multilayer-Ceramic-Capacitors-MLCC---SMD-SMT_HUI-JU-HUI-JU-NM1206B473M251CEGN_C2760348.html
footprint CAP-1206 (1206 (3216M) Capacitor)
pins: 1, 2

## NM1206B474K101CEGN
designator C?  Capacitance: 470nF  (hidden comment: *)
Capacitor, Ceramic (MLCC), 470nF, ±10%, 100V, X7R, ±10%, SMD 1206; Manufacturer: HUI JU; Manufacturer Part Number: NM1206B474K101CEGN; Package Size: 1206; JLCPCB Basic Part: No; JLCPCB Part Number: C710480; Supplier 1: LCSC; Category: Capacitors - MLCC; Supplier Part Number 1: C710480; Tolerance: ±10%; Voltage Rating: 100V; Temperature Coefficient: X7R; RoHS: Yes; ComponentLink1Description: Datasheet; ComponentLink1URL: https://wmsc.lcsc.com/wmsc/upload/file/pdf/v2/lcsc/2304140030_HUI-JU-NM1206B474K101CEGN_C710480.pdf; ComponentLink2Description: JLCPCB Part URL; ComponentLink2URL: https://jlcpcb.com/partdetail/C710480; ComponentLink3Description: LCSC Part URL; ComponentLink3URL: https://lcsc.com/product-detail/Multilayer-Ceramic-Capacitors-MLCC---SMD-SMT_HUI-JU-HUI-JU-NM1206B474K101CEGN_C710480.html
footprint CAP-1206 (1206 (3216M) Capacitor)
pins: 1, 2

## NM1206B474K201CEGN
designator C?  Capacitance: 470nF  (hidden comment: *)
Capacitor, Ceramic (MLCC), 470nF, ±10%, 200V, X7R, ±10%, SMD 1206; Manufacturer: HUI JU; Manufacturer Part Number: NM1206B474K201CEGN; Package Size: 1206; JLCPCB Basic Part: No; JLCPCB Part Number: C725802; Supplier 1: LCSC; Category: Capacitors - MLCC; Supplier Part Number 1: C725802; Tolerance: ±10%; Voltage Rating: 200V; Temperature Coefficient: X7R; RoHS: Yes; ComponentLink1Description: Datasheet; ComponentLink1URL: https://wmsc.lcsc.com/wmsc/upload/file/pdf/v2/lcsc/2407111141_HUI-JU-NM1206B474K201CEGN_C725802.pdf; ComponentLink2Description: JLCPCB Part URL; ComponentLink2URL: https://jlcpcb.com/partdetail/C725802; ComponentLink3Description: LCSC Part URL; ComponentLink3URL: https://lcsc.com/product-detail/Multilayer-Ceramic-Capacitors-MLCC---SMD-SMT_HUI-JU-HUI-JU-NM1206B474K201CEGN_C725802.html
footprint CAP-1206 (1206 (3216M) Capacitor)
pins: 1, 2

## NM1206B563K101CPBN
designator C?  Capacitance: 56nF  (hidden comment: *)
Capacitor, Ceramic (MLCC), 56nF, ±10%, 100V, ±10%, SMD 1206; Manufacturer: HUI JU; Manufacturer Part Number: NM1206B563K101CPBN; Package Size: 1206; JLCPCB Basic Part: No; JLCPCB Part Number: C2835167; Supplier 1: LCSC; Category: Capacitors - MLCC; Supplier Part Number 1: C2835167; Tolerance: ±10%; Voltage Rating: 100V; RoHS: Yes; ComponentLink1Description: Datasheet; ComponentLink1URL: https://wmsc.lcsc.com/wmsc/upload/file/pdf/v2/lcsc/2304140030_HUI-JU-NM1206B563K101CPBN_C2835167.pdf; ComponentLink2Description: JLCPCB Part URL; ComponentLink2URL: https://jlcpcb.com/partdetail/C2835167; ComponentLink3Description: LCSC Part URL; ComponentLink3URL: https://lcsc.com/product-detail/Multilayer-Ceramic-Capacitors-MLCC---SMD-SMT_HUI-JU-HUI-JU-NM1206B563K101CPBN_C2835167.html
footprint CAP-1206 (1206 (3216M) Capacitor)
pins: 1, 2

## NM1206B563K631CEGN
designator C?  Capacitance: 56nF  (hidden comment: *)
Capacitor, Ceramic (MLCC), 56nF, ±10%, 630V, X7R, ±10%, SMD 1206; Manufacturer: HUI JU; Manufacturer Part Number: NM1206B563K631CEGN; Package Size: 1206; JLCPCB Basic Part: No; JLCPCB Part Number: C717021; Supplier 1: LCSC; Category: Capacitors - MLCC; Supplier Part Number 1: C717021; Tolerance: ±10%; Voltage Rating: 630V; Temperature Coefficient: X7R; RoHS: Yes; ComponentLink1Description: Datasheet; ComponentLink1URL: https://wmsc.lcsc.com/wmsc/upload/file/pdf/v2/lcsc/2304140030_HUI-JU-NM1206B563K631CEGN_C717021.pdf; ComponentLink2Description: JLCPCB Part URL; ComponentLink2URL: https://jlcpcb.com/partdetail/C717021; ComponentLink3Description: LCSC Part URL; ComponentLink3URL: https://lcsc.com/product-detail/Multilayer-Ceramic-Capacitors-MLCC---SMD-SMT_HUI-JU-HUI-JU-NM1206B563K631CEGN_C717021.html
footprint CAP-1206 (1206 (3216M) Capacitor)
pins: 1, 2

## NM1206B564K101CEGN
designator C?  Capacitance: 560nF  (hidden comment: *)
Capacitor, Ceramic (MLCC), 560nF, ±10%, 100V, X7R, ±10%, SMD 1206; Manufacturer: HUI JU; Manufacturer Part Number: NM1206B564K101CEGN; Package Size: 1206; JLCPCB Basic Part: No; JLCPCB Part Number: C717022; Supplier 1: LCSC; Category: Capacitors - MLCC; Supplier Part Number 1: C717022; Tolerance: ±10%; Voltage Rating: 100V; Temperature Coefficient: X7R; RoHS: Yes; ComponentLink1Description: Datasheet; ComponentLink1URL: https://wmsc.lcsc.com/wmsc/upload/file/pdf/v2/lcsc/2304140030_HUI-JU-NM1206B564K101CEGN_C717022.pdf; ComponentLink2Description: JLCPCB Part URL; ComponentLink2URL: https://jlcpcb.com/partdetail/C717022; ComponentLink3Description: LCSC Part URL; ComponentLink3URL: https://lcsc.com/product-detail/Multilayer-Ceramic-Capacitors-MLCC---SMD-SMT_HUI-JU-HUI-JU-NM1206B564K101CEGN_C717022.html
footprint CAP-1206 (1206 (3216M) Capacitor)
pins: 1, 2

## NM1206B683K201CEGN
designator C?  Capacitance: 68nF  (hidden comment: *)
Capacitor, Ceramic (MLCC), 68nF, ±10%, 200V, ±10%, SMD 1206; Manufacturer: HUI JU; Manufacturer Part Number: NM1206B683K201CEGN; Package Size: 1206; JLCPCB Basic Part: No; JLCPCB Part Number: C841566; Supplier 1: LCSC; Category: Capacitors - MLCC; Supplier Part Number 1: C841566; Tolerance: ±10%; Voltage Rating: 200V; RoHS: Yes; ComponentLink1Description: Datasheet; ComponentLink1URL: https://wmsc.lcsc.com/wmsc/upload/file/pdf/v2/lcsc/2304140030_HUI-JU-NM1206B683K201CEGN_C841566.pdf; ComponentLink2Description: JLCPCB Part URL; ComponentLink2URL: https://jlcpcb.com/partdetail/C841566; ComponentLink3Description: LCSC Part URL; ComponentLink3URL: https://lcsc.com/product-detail/Multilayer-Ceramic-Capacitors-MLCC---SMD-SMT_HUI-JU-HUI-JU-NM1206B683K201CEGN_C841566.html
footprint CAP-1206 (1206 (3216M) Capacitor)
pins: 1, 2

## NM1206B683K251CEGN
designator C?  Capacitance: 68nF  (hidden comment: *)
Capacitor, Ceramic (MLCC), 68nF, ±10%, 250V, ±10%, SMD 1206; Manufacturer: HUI JU; Manufacturer Part Number: NM1206B683K251CEGN; Package Size: 1206; JLCPCB Basic Part: No; JLCPCB Part Number: C976247; Supplier 1: LCSC; Category: Capacitors - MLCC; Supplier Part Number 1: C976247; Tolerance: ±10%; Voltage Rating: 250V; RoHS: Yes; ComponentLink1Description: Datasheet; ComponentLink1URL: https://wmsc.lcsc.com/wmsc/upload/file/pdf/v2/lcsc/2012171208_HUI-JU-NM1206B683K251CEGN_C976247.pdf; ComponentLink2Description: JLCPCB Part URL; ComponentLink2URL: https://jlcpcb.com/partdetail/C976247; ComponentLink3Description: LCSC Part URL; ComponentLink3URL: https://lcsc.com/product-detail/Multilayer-Ceramic-Capacitors-MLCC---SMD-SMT_HUI-JU-HUI-JU-NM1206B683K251CEGN_C976247.html
footprint CAP-1206 (1206 (3216M) Capacitor)
pins: 1, 2

## NM1206B684K101CEGN
designator C?  Capacitance: 680nF  (hidden comment: *)
Capacitor, Ceramic (MLCC), 680nF, ±10%, 100V, X7R, ±10%, SMD 1206; Manufacturer: HUI JU; Manufacturer Part Number: NM1206B684K101CEGN; Package Size: 1206; JLCPCB Basic Part: No; JLCPCB Part Number: C710483; Supplier 1: LCSC; Category: Capacitors - MLCC; Supplier Part Number 1: C710483; Tolerance: ±10%; Voltage Rating: 100V; Temperature Coefficient: X7R; RoHS: Yes; ComponentLink1Description: Datasheet; ComponentLink1URL: https://wmsc.lcsc.com/wmsc/upload/file/pdf/v2/lcsc/2304140030_HUI-JU-NM1206B684K101CEGN_C710483.pdf; ComponentLink2Description: JLCPCB Part URL; ComponentLink2URL: https://jlcpcb.com/partdetail/C710483; ComponentLink3Description: LCSC Part URL; ComponentLink3URL: https://lcsc.com/product-detail/Multilayer-Ceramic-Capacitors-MLCC---SMD-SMT_HUI-JU-HUI-JU-NM1206B684K101CEGN_C710483.html
footprint CAP-1206 (1206 (3216M) Capacitor)
pins: 1, 2

## NM1206B684M101CEGN
designator C?  Capacitance: 680nF  (hidden comment: *)
Capacitor, Ceramic (MLCC), 680nF, ±20%, 100V, X7R, ±20%, SMD 1206; Manufacturer: HUI JU; Manufacturer Part Number: NM1206B684M101CEGN; Package Size: 1206; JLCPCB Basic Part: No; JLCPCB Part Number: C840130; Supplier 1: LCSC; Category: Capacitors - MLCC; Supplier Part Number 1: C840130; Tolerance: ±20%; Voltage Rating: 100V; Temperature Coefficient: X7R; RoHS: Yes; ComponentLink1Description: Datasheet; ComponentLink1URL: https://wmsc.lcsc.com/wmsc/upload/file/pdf/v2/lcsc/2304140030_HUI-JU-NM1206B684M101CEGN_C840130.pdf; ComponentLink2Description: JLCPCB Part URL; ComponentLink2URL: https://jlcpcb.com/partdetail/C840130; ComponentLink3Description: LCSC Part URL; ComponentLink3URL: https://lcsc.com/product-detail/Multilayer-Ceramic-Capacitors-MLCC---SMD-SMT_HUI-JU-HUI-JU-NM1206B684M101CEGN_C840130.html
footprint CAP-1206 (1206 (3216M) Capacitor)
pins: 1, 2

## NM1206B823K101CPBN
designator C?  Capacitance: 82nF  (hidden comment: *)
Capacitor, Ceramic (MLCC), 82nF, 100V, SMD 1206; Manufacturer: HUI JU; Manufacturer Part Number: NM1206B823K101CPBN; Package Size: 1206; JLCPCB Basic Part: No; JLCPCB Part Number: C2835173; Supplier 1: LCSC; Category: Capacitors - MLCC; Supplier Part Number 1: C2835173; Voltage Rating: 100V; RoHS: Yes; ComponentLink1Description: Datasheet; ComponentLink1URL: https://wmsc.lcsc.com/wmsc/upload/file/pdf/v2/lcsc/2304140030_HUI-JU-NM1206B823K101CPBN_C2835173.pdf; ComponentLink2Description: JLCPCB Part URL; ComponentLink2URL: https://jlcpcb.com/partdetail/C2835173; ComponentLink3Description: LCSC Part URL; ComponentLink3URL: https://lcsc.com/product-detail/Multilayer-Ceramic-Capacitors-MLCC---SMD-SMT_HUI-JU-HUI-JU-NM1206B823K101CPBN_C2835173.html
footprint CAP-1206 (1206 (3216M) Capacitor)
pins: 1, 2

## NM1206B824K101CEGN
designator C?  Capacitance: 820nF  (hidden comment: *)
Capacitor, Ceramic (MLCC), 820nF, ±10%, 100V, X7R, ±10%, SMD 1206; Manufacturer: HUI JU; Manufacturer Part Number: NM1206B824K101CEGN; Package Size: 1206; JLCPCB Basic Part: No; JLCPCB Part Number: C840131; Supplier 1: LCSC; Category: Capacitors - MLCC; Supplier Part Number 1: C840131; Tolerance: ±10%; Voltage Rating: 100V; Temperature Coefficient: X7R; RoHS: Yes; ComponentLink1Description: Datasheet; ComponentLink1URL: https://wmsc.lcsc.com/wmsc/upload/file/pdf/v2/lcsc/2304140030_HUI-JU-NM1206B824K101CEGN_C840131.pdf; ComponentLink2Description: JLCPCB Part URL; ComponentLink2URL: https://jlcpcb.com/partdetail/C840131; ComponentLink3Description: LCSC Part URL; ComponentLink3URL: https://lcsc.com/product-detail/Multilayer-Ceramic-Capacitors-MLCC---SMD-SMT_HUI-JU-HUI-JU-NM1206B824K101CEGN_C840131.html
footprint CAP-1206 (1206 (3216M) Capacitor)
pins: 1, 2

## NV1206B102K102CEDN
designator C?  Capacitance: 1nF  (hidden comment: *)
Capacitor, Ceramic (MLCC), 1nF, ±10%, 1kV, ±10%, SMD 1206; Manufacturer: HUI JU; Manufacturer Part Number: NV1206B102K102CEDN; Package Size: 1206; JLCPCB Basic Part: No; JLCPCB Part Number: C2835166; Supplier 1: LCSC; Category: Capacitors - MLCC; Supplier Part Number 1: C2835166; Tolerance: ±10%; Voltage Rating: 1kV; RoHS: Yes; ComponentLink1Description: Datasheet; ComponentLink1URL: https://wmsc.lcsc.com/wmsc/upload/file/pdf/v2/lcsc/2304140030_HUI-JU-NV1206B102K102CEDN_C2835166.pdf; ComponentLink2Description: JLCPCB Part URL; ComponentLink2URL: https://jlcpcb.com/partdetail/C2835166; ComponentLink3Description: LCSC Part URL; ComponentLink3URL: https://lcsc.com/product-detail/Multilayer-Ceramic-Capacitors-MLCC---SMD-SMT_HUI-JU-HUI-JU-NV1206B102K102CEDN_C2835166.html
footprint CAP-1206 (1206 (3216M) Capacitor)
pins: 1, 2

## NV1206B102K102CPBN
designator C?  Capacitance: 1nF  (hidden comment: *)
Capacitor, Ceramic (MLCC), 1nF, ±10%, 1kV, ±10%, SMD 1206; Manufacturer: HUI JU; Manufacturer Part Number: NV1206B102K102CPBN; Package Size: 1206; JLCPCB Basic Part: No; JLCPCB Part Number: C915792; Supplier 1: LCSC; Category: Capacitors - MLCC; Supplier Part Number 1: C915792; Tolerance: ±10%; Voltage Rating: 1kV; RoHS: Yes; ComponentLink1Description: Datasheet; ComponentLink1URL: https://wmsc.lcsc.com/wmsc/upload/file/pdf/v2/lcsc/2304140030_HUI-JU-NV1206B102K102CPBN_C915792.pdf; ComponentLink2Description: JLCPCB Part URL; ComponentLink2URL: https://jlcpcb.com/partdetail/C915792; ComponentLink3Description: LCSC Part URL; ComponentLink3URL: https://lcsc.com/product-detail/Multilayer-Ceramic-Capacitors-MLCC---SMD-SMT_HUI-JU-HUI-JU-NV1206B102K102CPBN_C915792.html
footprint CAP-1206 (1206 (3216M) Capacitor)
pins: 1, 2

## NV1206B102K202CEDN
designator C?  Capacitance: 1nF  (hidden comment: *)
Capacitor, Ceramic (MLCC), 1nF, ±10%, 2kV, X7R, ±10%, SMD 1206; Manufacturer: HUI JU; Manufacturer Part Number: NV1206B102K202CEDN; Package Size: 1206; JLCPCB Basic Part: No; JLCPCB Part Number: C710463; Supplier 1: LCSC; Category: Capacitors - MLCC; Supplier Part Number 1: C710463; Tolerance: ±10%; Voltage Rating: 2kV; Temperature Coefficient: X7R; RoHS: Yes; ComponentLink1Description: Datasheet; ComponentLink1URL: https://wmsc.lcsc.com/wmsc/upload/file/pdf/v2/lcsc/2304140030_HUI-JU-NV1206B102K202CEDN_C710463.pdf; ComponentLink2Description: JLCPCB Part URL; ComponentLink2URL: https://jlcpcb.com/partdetail/C710463; ComponentLink3Description: LCSC Part URL; ComponentLink3URL: https://lcsc.com/product-detail/Multilayer-Ceramic-Capacitors-MLCC---SMD-SMT_HUI-JU-HUI-JU-NV1206B102K202CEDN_C710463.html
footprint CAP-1206 (1206 (3216M) Capacitor)
pins: 1, 2

## NV1206B102M102CPBN
designator C?  Capacitance: 1nF  (hidden comment: *)
Capacitor, Ceramic (MLCC), 1nF, ±20%, 1kV, ±20%, SMD 1206; Manufacturer: HUI JU; Manufacturer Part Number: NV1206B102M102CPBN; Package Size: 1206; JLCPCB Basic Part: No; JLCPCB Part Number: C841552; Supplier 1: LCSC; Category: Capacitors - MLCC; Supplier Part Number 1: C841552; Tolerance: ±20%; Voltage Rating: 1kV; RoHS: Yes; ComponentLink1Description: Datasheet; ComponentLink1URL: https://wmsc.lcsc.com/wmsc/upload/file/pdf/v2/lcsc/2304140030_HUI-JU-NV1206B102M102CPBN_C841552.pdf; ComponentLink2Description: JLCPCB Part URL; ComponentLink2URL: https://jlcpcb.com/partdetail/C841552; ComponentLink3Description: LCSC Part URL; ComponentLink3URL: https://lcsc.com/product-detail/Multilayer-Ceramic-Capacitors-MLCC---SMD-SMT_HUI-JU-HUI-JU-NV1206B102M102CPBN_C841552.html
footprint CAP-1206 (1206 (3216M) Capacitor)
pins: 1, 2

## NV1206B102M202CEDN
designator C?  Capacitance: 1nF  (hidden comment: *)
Capacitor, Ceramic (MLCC), 1nF, ±20%, 2kV, ±20%, SMD 1206; Manufacturer: HUI JU; Manufacturer Part Number: NV1206B102M202CEDN; Package Size: 1206; JLCPCB Basic Part: No; JLCPCB Part Number: C780708; Supplier 1: LCSC; Category: Capacitors - MLCC; Supplier Part Number 1: C780708; Tolerance: ±20%; Voltage Rating: 2kV; RoHS: Yes; ComponentLink1Description: Datasheet; ComponentLink1URL: https://wmsc.lcsc.com/wmsc/upload/file/pdf/v2/lcsc/2304140030_HUI-JU-NV1206B102M202CEDN_C780708.pdf; ComponentLink2Description: JLCPCB Part URL; ComponentLink2URL: https://jlcpcb.com/partdetail/C780708; ComponentLink3Description: LCSC Part URL; ComponentLink3URL: https://lcsc.com/product-detail/Multilayer-Ceramic-Capacitors-MLCC---SMD-SMT_HUI-JU-HUI-JU-NV1206B102M202CEDN_C780708.html
footprint CAP-1206 (1206 (3216M) Capacitor)
pins: 1, 2

## NV1206B103K182CEGN
designator C?  Capacitance: 10nF  (hidden comment: *)
Capacitor, Ceramic (MLCC), 10nF, 1800V, X7R, SMD 1206; Manufacturer: HUI JU; Manufacturer Part Number: NV1206B103K182CEGN; Package Size: 1206; JLCPCB Basic Part: No; JLCPCB Part Number: C5272920; Supplier 1: LCSC; Category: Capacitors - MLCC; Supplier Part Number 1: C5272920; Voltage Rating: 1800V; Temperature Coefficient: X7R; RoHS: Yes; ComponentLink1Description: Datasheet; ComponentLink1URL: https://wmsc.lcsc.com/wmsc/upload/file/pdf/v2/lcsc/2211161100_HUI-JU-NV1206B103K182CEGN_C5272920.pdf; ComponentLink2Description: JLCPCB Part URL; ComponentLink2URL: https://jlcpcb.com/partdetail/C5272920; ComponentLink3Description: LCSC Part URL; ComponentLink3URL: https://lcsc.com/product-detail/Multilayer-Ceramic-Capacitors-MLCC---SMD-SMT_HUI-JU-HUI-JU-NV1206B103K182CEGN_C5272920.html
footprint CAP-1206 (1206 (3216M) Capacitor)
pins: 1, 2